# Altium footprint library Inductor.PcbLib: 75 footprints (part 5 of 5)
Each footprint in its own frame and in the unit in brackets; x right, y up, seen from the top. Pads: shape width x height; smd on the part's side, far side on the other; paste and mask are expansions set on the pad; w line width, h text height; cw(c..) or ccw(c..) is an arc to the next point about the centre after c.
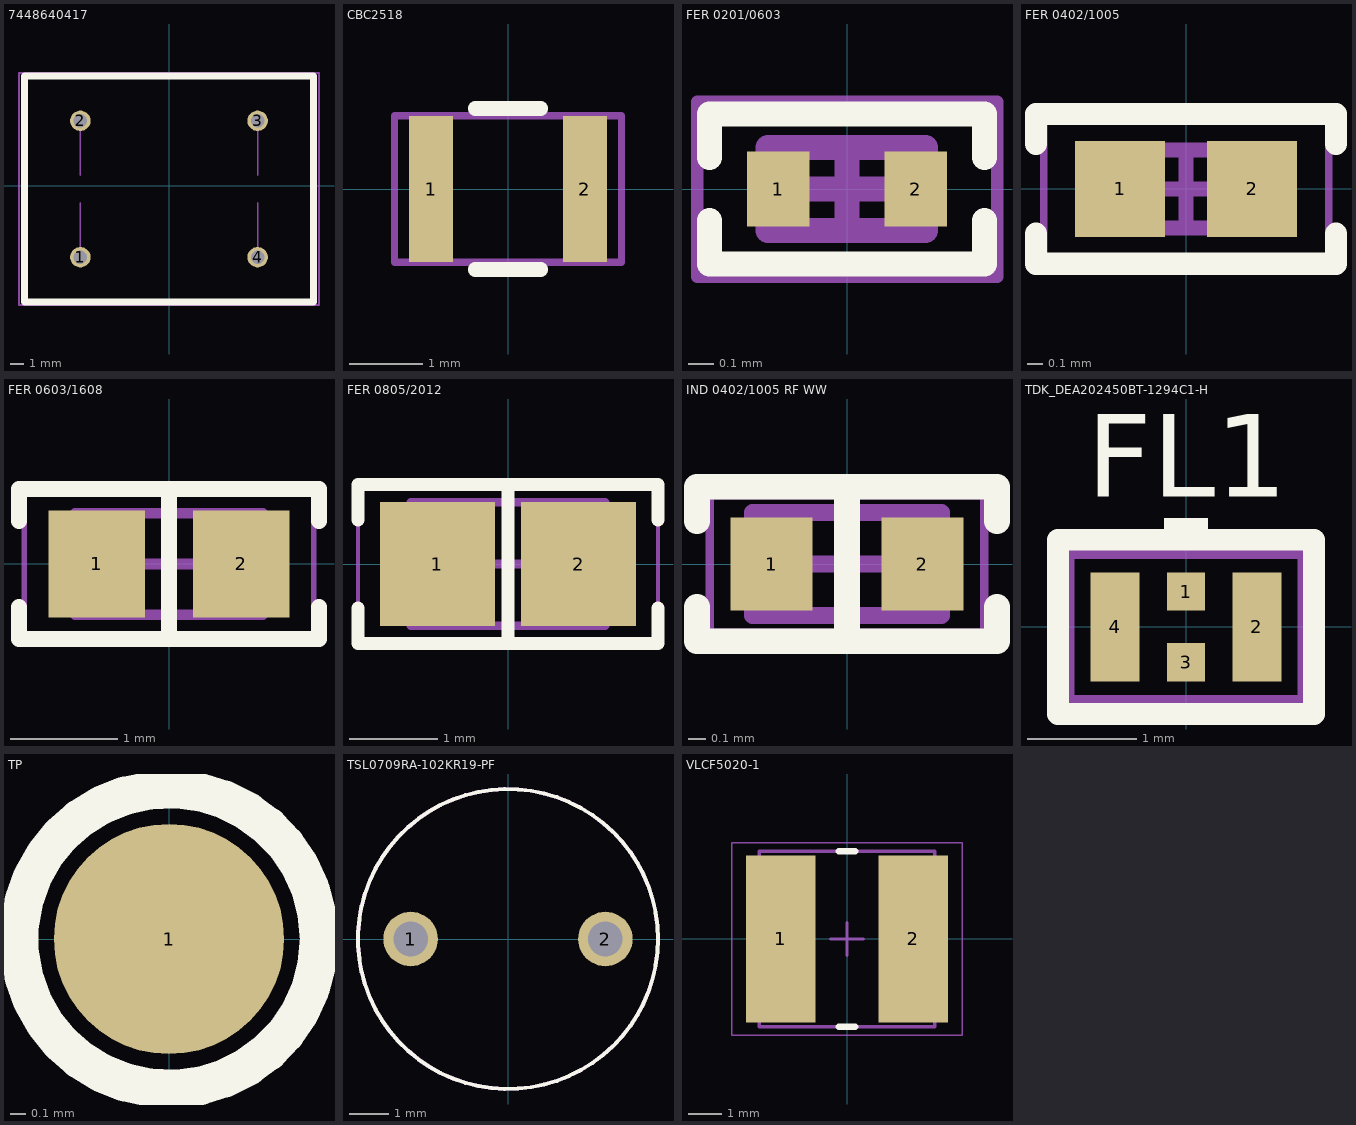
[diagram p4: the footprints below, top view; thin cyan lines are the x and y axes]

## 7448640417 [mm]
pads (4):
  round 1.5 hole 1: 1(-6.5,-5.254) 2(-6.5,4.746) 3(6.5,4.746) 4(6.5,-5.254)
Top Overlay:
  lines w0.508: -10.6,-8.554 10.6,-8.554 10.6,8.046 -10.6,8.046 -10.6,-8.554
Mechanical 15:
  lines w0.127: -6.5,-5.254 -6.5,-1.254 ; -6.5,0.746 -6.5,4.746 ; 6.5,-5.254 6.5,-1.254 ; 6.5,0.746 6.5,4.746
Mechanical 20:
  lines w0.127: -11,-8.754 -11,8.246 11,8.246 11,-8.754 -11,-8.754

## CBC2518 [mm]
pads (2):
  rect 0.6x2 smd: 1(-1.05,0) 2(1.05,0)
Top Overlay:
  lines w0.2: -0.45,-1.1 0.45,-1.1 ; -0.45,1.1 0.45,1.1
Mechanical 5:
  lines w0.1: -1.55,-1 1.55,-1 1.55,1 -1.55,1 -1.55,-1
3D body: height 2, standoff 0, extent 0.701,-0.999 1.349,0.999
3D body: height 2, standoff 0, extent -1.349,-0.999 -0.701,0.999
3D body: height 2, standoff 0, extent -0.699,-0.999 0.699,0.999

## FER 0201/0603 [mm] "Chip Inductor, 2-Leads, Body 0.60x0.30mm, IPC Medium Density"
height 0.33
pads (2):
  rect 0.25x0.3 smd: 1(-0.275,0) 2(0.275,0)
Top Overlay:
  lines w0.1: -0.55,-0.125 -0.55,-0.3 0.55,-0.3 0.55,-0.125 ; -0.55,0.125 -0.55,0.3 0.55,0.3 0.55,0.125
Mechanical 13:
  lines w0.1: -0.315,-0.165 0.315,-0.165 0.315,0.165 -0.315,0.165 -0.315,-0.165
Mechanical 15:
  lines w0.05: -0.6,-0.35 0.6,-0.35 0.6,0.35 -0.6,0.35 -0.6,-0.35
  lines w0.1: -0.165,0 0.165,0 ; 0,-0.165 0,0.165
3D body "FER 0201.STEP": height 0.29, standoff -0.01, extent -0.3,-0.15 0.3,0.15

## FER 0402/1005 [mm] "Chip Ferrite, 2-Leads, Body 1.02x0.51mm, IPC Medium Density"
height 0.52
pads (2):
  rect 0.6x0.64 smd: 1(-0.44,0) 2(0.44,0)
Top Overlay:
  lines w0.15: -1,-0.3 -1,-0.5 1,-0.5 1,-0.3 ; -1,0.3 -1,0.5 1,0.5 1,0.3
Mechanical 13:
  lines w0.1: -0.515,-0.26 -0.515,0.26 0.515,0.26 0.515,-0.26 -0.515,-0.26
Mechanical 15:
  lines w0.05: -0.95,-0.5 -0.95,0.5 0.95,0.5 0.95,-0.5 -0.95,-0.5
  lines w0.1: -0.26,0 0.26,0 ; 0,-0.26 0,0.26
3D body "FER 0402.STEP": height 0.52, standoff 0, extent -0.5,-0.262 0.5,0.262

## FER 0603/1608 [mm] "Chip Ferrite, 2-Leads, Body 1.60x0.80mm, IPC Medium Density"
height 0.89
pads (2):
  rect 0.9x1 smd: 1(-0.675,0) 2(0.675,0)
Top Overlay:
  lines w0.15: -1.4,-0.4 -1.4,-0.7 1.4,-0.7 1.4,-0.4 ; -1.4,0.4 -1.4,0.7 1.4,0.7 1.4,0.4 ; 0,-0.7 0,0.7
Mechanical 13:
  lines w0.1: -0.875,-0.475 0.875,-0.475 0.875,0.475 -0.875,0.475 -0.875,-0.475
Mechanical 15:
  lines w0.05: -1.35,-0.75 1.35,-0.75 1.35,0.75 -1.35,0.75 -1.35,-0.75
  lines w0.1: -0.475,0 0.475,0 ; 0,-0.475 0,0.475
3D body "FER 0603.STEP": height 0.82, standoff 0, extent -0.8,-0.412 0.8,0.412

## FER 0805/2012 [mm] "Chip Ferrite, 2-Leads, Body 2.00x1.20mm, IPC Medium Density"
height 1.15
pads (2):
  rect 1.3x1.4 smd: 1(-0.8,0) 2(0.8,0)
Top Overlay:
  lines w0.15: -1.7,-0.5 -1.7,-0.9 1.7,-0.9 1.7,-0.5 ; -1.7,0.5 -1.7,0.9 1.7,0.9 1.7,0.5 ; 0,-0.9 0,0.9
Mechanical 13:
  lines w0.1: -1.1,-0.7 -1.1,0.7 1.1,0.7 1.1,-0.7 -1.1,-0.7
Mechanical 15:
  lines w0.05: -1.7,-0.95 -1.7,0.95 1.7,0.95 1.7,-0.95 -1.7,-0.95
  lines w0.1: -0.5,0 0.5,0 ; 0,-0.5 0,0.5
3D body "FER 0805.STEP": height 1.26, standoff -0.02, extent -1,-0.637 1,0.637

## IND 0402/1005 RF WW [mm] "Chip Inductor, 2-Leads, Body 1.00x0.50mm, IPC High Density"
height 0.6
pads (2):
  rect 0.48x0.54 smd: 1(-0.44,0) 2(0.44,0)
Top Overlay:
  lines w0.15: -0.875,-0.25 -0.875,-0.45 0.875,-0.45 0.875,-0.25 ; -0.875,0.25 -0.875,0.45 0.875,0.45 0.875,0.25 ; 0,-0.45 0,0.45
Mechanical 13:
  lines w0.1: -0.55,-0.3 -0.55,0.3 0.55,0.3 0.55,-0.3 -0.55,-0.3
Mechanical 15:
  lines w0.05: -0.8,-0.4 -0.8,0.4 0.8,0.4 0.8,-0.4 -0.8,-0.4
  lines w0.1: -0.3,0 0.3,0 ; 0,-0.3 0,0.3
3D body "IND-WireWound.STEP": height 0.5, standoff 0, extent -0.5,-0.276 0.5,0.277
3D body "IND-WireWound_TOP.STEP": height 0.51, standoff 0.26, extent -0.5,-0.287 0.5,0.287

## TDK_DEA202450BT-1294C1-H [mm]
pads (4):
  rect 0.35x0.35 smd: 1(0,0.325) 3(0,-0.325)
  rect 0.45x1 smd paste-1.27: 2(0.65,0) 4(-0.65,0)
Top Overlay:
  rectangle: -0.2,0.8 0.2,1
  lines w0.2: -1.175,-0.8 -1.175,0.8 1.175,0.8 1.175,-0.8 -1.175,-0.8
  text "FL1" at -0.913,1.194 h0.76
Top Paste:
  rectangle: 0.483,0.051 0.838,0.432
  rectangle: 0.483,-0.432 0.838,-0.025
  rectangle: -0.838,-0.432 -0.483,-0.025
  rectangle: -0.838,0.051 -0.483,0.432
Mechanical 5:
  rectangle: -0.2,0.675 0.2,0.9
  lines w0.1: -1.075,-0.675 1.075,-0.675 1.075,0.675 -1.075,0.675 -1.075,-0.675
3D body: height 0.7, standoff 0, extent -1.075,-0.675 1.075,0.675
3D body: height 0.8, standoff 0.7, extent -1.075,-0.675 1.075,0.675
3D body: height 0.8, standoff 0.7, extent -0.8,-0.4 -0.2,0.4

## TP [mil]
pads (1):
  round 60 smd: 1(0,0)
Top Overlay:
  circle w10: c0,0 r39.05

## TSL0709RA-102KR19-PF [mm]
pads (2):
  round 1.4 hole 0.89: 1(-2.5,0) 2(2.5,0)
Top Overlay:
  circle w0.1: c0,0 r3.85
Mechanical 15:
  circle w0.1: c0,0 r3.85

## VLCF5020-1 [mm]
pads (2):
  rect 2.1x5.05 smd: 1(-2,0) 2(2,0)
Top Overlay:
  lines w0.2: -0.25,-2.65 0.25,-2.65 ; -0.25,2.65 0.25,2.65
Mechanical 13:
  lines w0.1: -2.65,-2.65 2.65,-2.65 2.65,2.65 -2.65,2.65 -2.65,-2.65
Mechanical 15:
  lines w0.05: -3.475,-2.9 3.475,-2.9 3.475,2.9 -3.475,2.9 -3.475,-2.9
  lines w0.1: -0.5,0 0.5,0 ; 0,-0.5 0,0.5
3D body "VLCF5020-1.step": height 2.1, standoff 0, extent -2.675,-2.575 2.675,2.575